# Altium footprint library Caps.PcbLib: 75 footprints (part 5 of 5)
Each footprint in its own frame and in the unit in brackets; x right, y up, seen from the top. Pads: shape width x height; smd on the part's side, far side on the other; paste and mask are expansions set on the pad; w line width, h text height; cw(c..) or ccw(c..) is an arc to the next point about the centre after c.
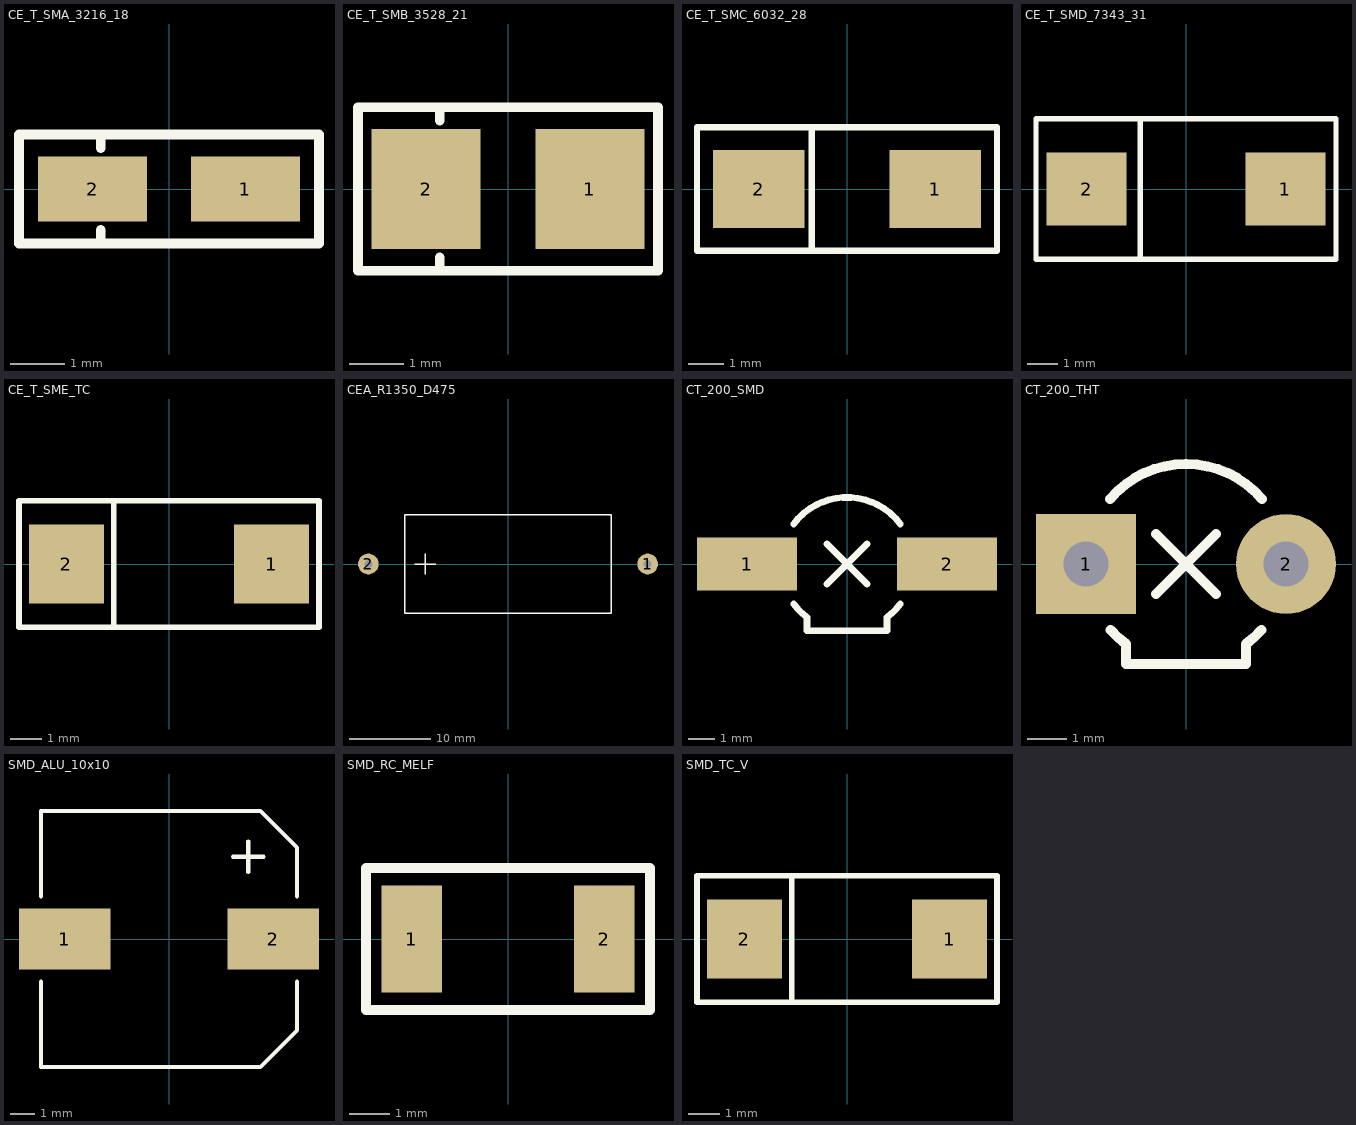
[diagram p4: the footprints below, top view; thin cyan lines are the x and y axes]

## CE_T_SMA_3216_18 [mm] "Tantalum Cap Housing SMA type"
height 1.803
pads (2):
  rect 2x1.2 smd: 1(1.4,0) 2(-1.4,0)
Top Overlay:
  lines w0.178: -1.25,-1 -1.25,-0.75 ; -1.25,0.75 -1.25,1 ; -2.75,-1 2.75,-1 2.75,1 -2.75,1 -2.75,-1
3D body "SMA_10uF_Tantal.STEP": height 1.8, standoff -0.05, extent -1.65,-0.8 1.65,0.8

## CE_T_SMB_3528_21 [mm] "Tantalum Cap Housing SMB type"
height 2.1
pads (2):
  rect 2x2.2 smd: 1(1.5,0) 2(-1.5,0)
Top Overlay:
  lines w0.178: -1.25,-1.5 -1.25,-1.25 ; -1.25,1.25 -1.25,1.5 ; -2.75,-1.5 2.75,-1.5 2.75,1.5 -2.75,1.5 -2.75,-1.5
3D body "SMB_10uF_Tantal.STEP": height 2.1, standoff -0.05, extent -1.75,-1.4 1.75,1.4

## CE_T_SMC_6032_28 [mm] "Tantalum Cap Housing SMC type"
height 2.8
pads (2):
  rect 2.6x2.2 smd: 1(2.5,0) 2(-2.5,0)
Top Overlay:
  lines w0.178: -1,-1.75 -1,1.75 ; -4.25,-1.75 4.25,-1.75 4.25,1.75 -4.25,1.75 -4.25,-1.75
3D body "SMC_22uF_Tantal.STEP": height 2.84, standoff -0.01, extent -3,-1.6 3,1.6

## CE_T_SMD_7343_31 [mm] "Tantalum Cap Housing SMD type"
height 3.1
pads (2):
  rect 2.6x2.4 smd: 1(3.25,0) 2(-3.25,0)
Top Overlay:
  lines w0.178: -1.5,-2.3 -1.5,2.3 ; -4.9,-2.3 4.9,-2.3 4.9,2.3 -4.9,2.3 -4.9,-2.3
3D body "SMD_47uF_Tantal.STEP": height 3.13, standoff -0.02, extent -3.65,-2.15 3.65,2.15

## CE_T_SME_TC [mil] "Rozmiar SMD_E (kondensator tantalowy)"
height 157
pads (2):
  rect 95x100 smd: 1(130,0) 2(-130,0)
Top Overlay:
  lines w7: -70,-80 -70,80 ; -190,-80 190,-80 190,80 -190,80 -190,-80

## CEA_R1350_D475 [mil] "CE Axial raster=1350mil, diameter=475mil"
height 475
pads (2):
  round 100 hole 38: 1(675,0) 2(-675,0)
Top Overlay:
  lines w7: -450,0 -350,0 ; -400,-50 -400,50 ; -500,-237.5 500,-237.5 500,237.5 -500,237.5 -500,-237.5

## CT_200_SMD [mil] "Trymer 3-15pF (Bia³y), SMD"
height 200
pads (2):
  rect 150x80 smd: 1(-150,0) 2(150,0)
Top Overlay:
  lines w10: -80,-60 ccw(c0,0) -60,-80 -60,-100 60,-100 60,-80 ccw(c0,0) 80,-60 ; -80,60 cw(c0,0) 80,60 ; -30,-30 30,30 ; -30,30 30,-30

## CT_200_THT [mil] "Trymer 3-15pF (Bia³y), raster 200mils"
height 200
pads (2):
  rect 100x100 hole 45: 1(-100,0)
  round 100 hole 45: 2(100,0)
Top Overlay:
  lines w10: -75.93,65.08 cw(c0,0) 75.93,65.08 ; -75.26,-65.85 ccw(c0,0) -60,-80 -60,-100 60,-100 60,-80 ccw(c0,0) 75.26,-65.85 ; -30,-30 30,30 ; -30,30 30,-30

## SMD_ALU_10x10 [mm] "SMD Aluminiowy Œrednica 10mm wysokoœæ 10mm"
height 11
pads (2):
  rect 3.81x2.54 smd: 1(-4.35,0) 2(4.35,0)
Top Overlay:
  lines w0.178: -5.334,-1.778 -5.334,-5.334 3.81,-5.334 5.334,-3.81 5.334,-1.778 ; -5.334,1.778 -5.334,5.334 3.81,5.334 5.334,3.81 5.334,1.778 ; 2.667,3.429 3.937,3.429 ; 3.302,2.794 3.302,4.064
3D body "C_ALU_10x10_5.STEP": height 10.5, standoff 0, extent -5.65,-5.15 5.65,5.15

## SMD_RC_MELF [mil] "Rozmiar MELF"
pads (2):
  rect 60x106 smd: 1(-95,0) 2(95,0)
Top Overlay:
  lines w10: -140,-70 140,-70 140,70 -140,70 -140,-70
3D body: height 101.9, standoff 0.1, extent 70,-50.8 95,50.8
3D body: height 101.9, standoff 0.1, extent -95,-50.8 -70,50.8
3D body: height 100.9, standoff 1.1, extent -70,-50 70,49.61

## SMD_TC_V [mil] "Rozmiar SMD_V (kondensator tantalowy)"
height 79
pads (2):
  rect 95x100 smd: 1(130,0) 2(-130,0)
Top Overlay:
  lines w7: -70,-80 -70,80 ; -190,-80 190,-80 190,80 -190,80 -190,-80